# Altium footprint library WR-FPC_1.00mm.PcbLib: 105 footprints (part 4 of 7)
Each footprint in its own frame and in the unit in brackets; x right, y up, seen from the top. Pads: shape width x height; smd on the part's side, far side on the other; paste and mask are expansions set on the pad; w line width, h text height; cw(c..) or ccw(c..) is an arc to the next point about the centre after c.
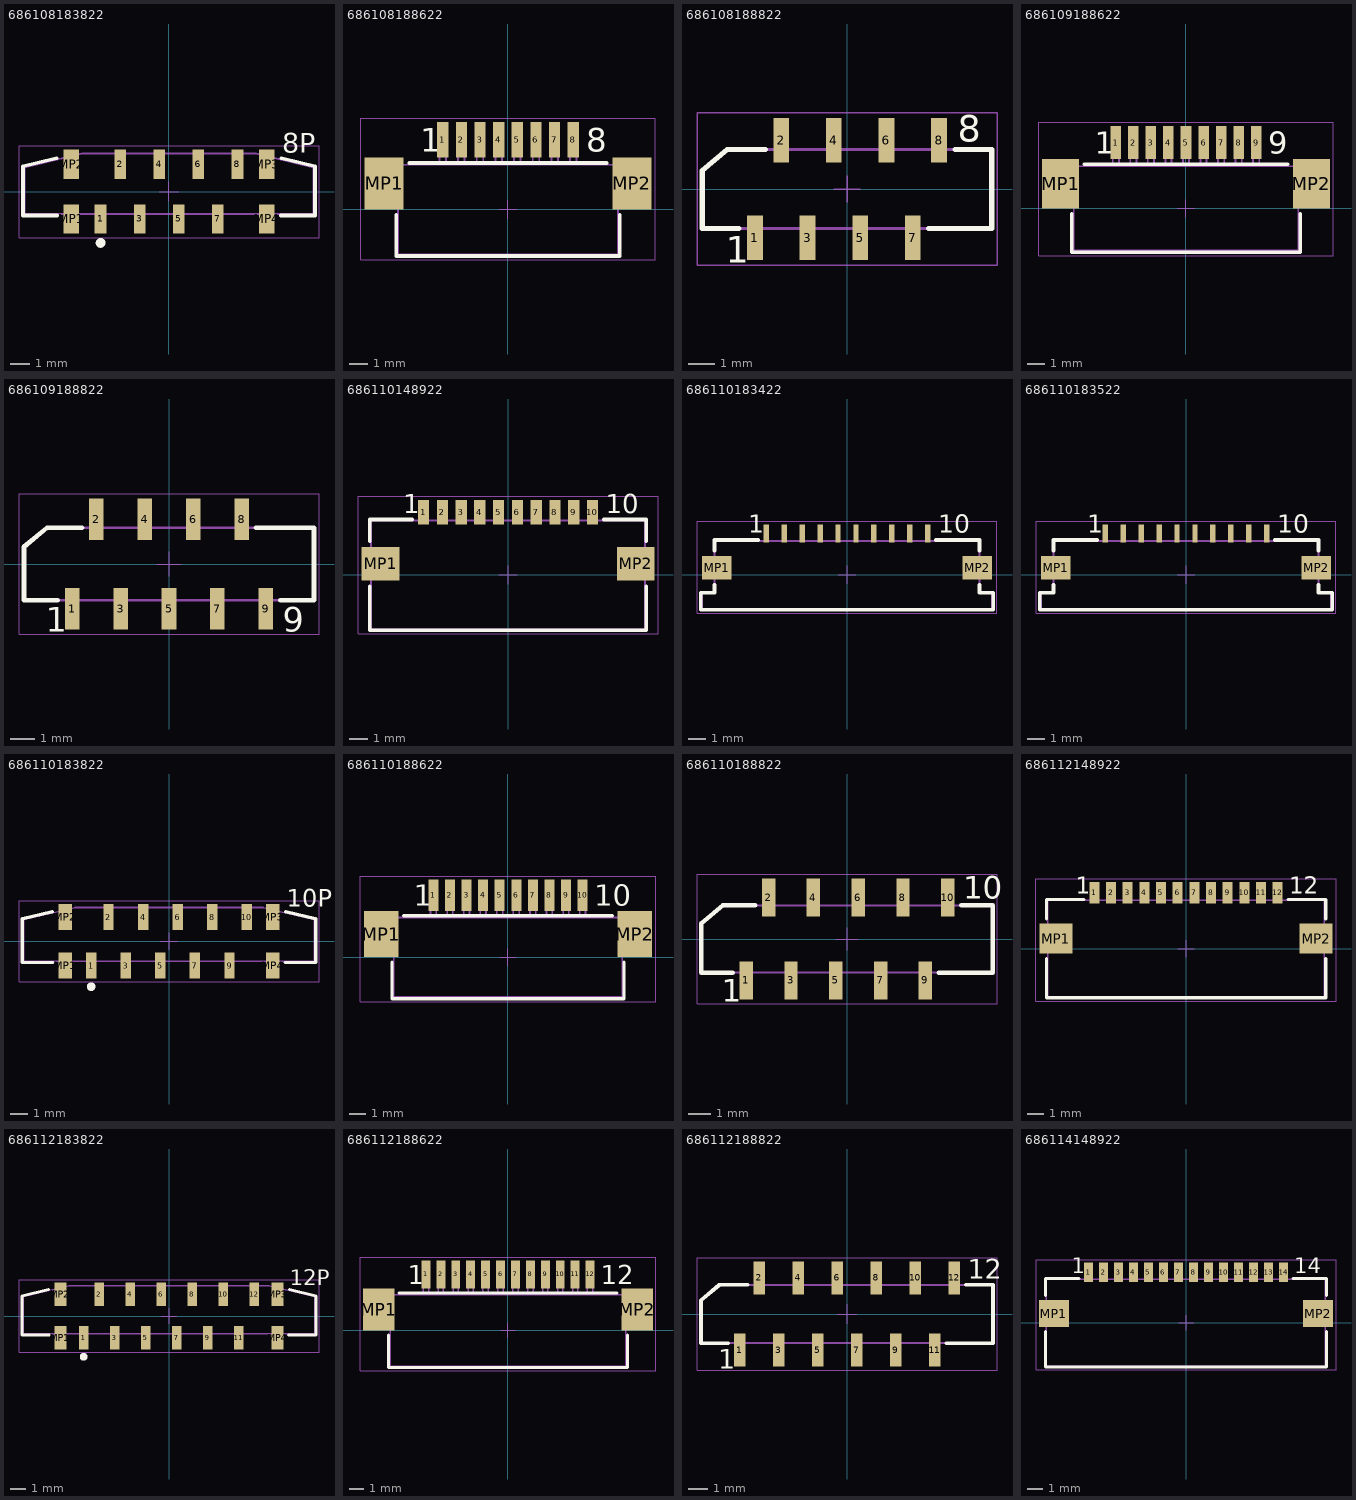
[diagram p3: the footprints below, top view; thin cyan lines are the x and y axes]

## 686108183822 [mm] "ZIF Connectors, Vertical, Type A, pitch 1mm, 8p"
height 4
pads (12):
  rect 0.6x1.5 smd: 1(-3.5,-1.4) 2(-2.5,1.4) 3(-1.5,-1.4) 4(-0.5,1.4) 5(0.5,-1.4) 6(1.5,1.4) 7(2.5,-1.4) 8(3.5,1.4)
  rect 0.8x1.5 smd: MP1(-5,-1.4) MP2(-5,1.4) MP3(5,1.4) MP4(5,-1.4)
Top Overlay:
  circle w0.25: c-3.5,-2.625 r0.125
  lines w0.2: -5.765,1.708 -7.475,1.297 -7.475,-1.225 -5.725,-1.225 ; 5.725,-1.225 7.475,-1.225 7.475,1.297 5.765,1.708
  text "8P" at 5.8,2 h1.02
Mechanical 13:
  lines w0.1: -7.4,-1.15 7.4,-1.15 7.4,1.24 4.45,1.949 -4.45,1.95 -7.4,1.24 -7.4,-1.15
Mechanical 15:
  lines w0.05: -0.5,0 0.5,0 ; 0,-0.5 0,0.5 ; -7.675,-2.35 7.675,-2.35 7.675,2.35 -7.675,2.35 -7.675,-2.35
3D body "686108183822.stp": height 4, standoff -0.02, extent -7.4,-1.65 7.4,1.95

## 686108188622 [mm] "LIF Connectors, Horizontal, Top Contact, pitch 1mm, 8p"
height 3.1
pads (10):
  rect 0.6x1.9 smd: 1(-3.5,3.75) 2(-2.5,3.75) 3(-1.5,3.75) 4(-0.5,3.75) 5(0.5,3.75) 6(1.5,3.75) 7(2.5,3.75) 8(3.5,3.75)
  rect 2.1x2.8 smd: MP1(-6.65,1.4) MP2(6.65,1.4)
Top Overlay:
  lines w0.2: -6,-0.3 -6,-2.5 6,-2.5 6,-0.3 ; -5.3,2.5 5.3,2.5
  text "8" at 4.2,3.1 h1.27
  text "1" at -4.7,3.1 h1.27
Mechanical 13:
  lines w0.1: -3.675,2.4 -3.675,4.4 -3.325,4.4 -3.325,2.4 ; -2.675,2.4 -2.675,4.4 -2.325,4.4 -2.325,2.4 ; -1.675,2.4 -1.675,4.4 -1.325,4.4 -1.325,2.4 ; -0.675,2.4 -0.675,4.4 -0.325,4.4 -0.325,2.4 ; 0.325,2.4 0.325,4.4 0.675,4.4 0.675,2.4 ; 1.325,2.4 1.325,4.4 1.675,4.4 1.675,2.4 ; 2.325,2.4 2.325,4.4 2.675,4.4 2.675,2.4 ; 3.325,2.4 3.325,4.4 3.675,4.4 3.675,2.4 ; -7.15,0.4 -5.9,0.4 -5.9,-2.4 5.9,-2.4 5.9,0.4 7.15,0.4 7.15,2.4 -7.15,2.4 -7.15,0.4
Mechanical 15:
  lines w0.05: -0.5,0 0.5,0 ; 0,-0.5 0,0.5 ; -7.9,-2.7 7.9,-2.7 7.9,4.9 -7.9,4.9 -7.9,-2.7
3D body "686108188622.stp": height 3.1, standoff -0.01, extent -7.15,-2.4 7.15,4.4

## 686108188822 [mm] "LIF Connectors, Vertical Type A,  pitch 1mm, 8p"
height 5.1
pads (8):
  rect 0.6x1.7 smd: 1(-3.5,-1.85) 2(-2.5,1.85) 3(-1.5,-1.85) 4(-0.5,1.85) 5(0.5,-1.85) 6(1.5,1.85) 7(2.5,-1.85) 8(3.5,1.85)
Top Overlay:
  lines w0.2: -4.1,-1.5 -5.5,-1.5 -5.5,0.7 -4.547,1.5 -3.1,1.5 ; 3.1,-1.5 5.5,-1.5 5.5,1.5 4.1,1.5
  text "1" at -4.6,-2.8 h1.02
  text "8" at 4.2,1.8 h1.02
Mechanical 13:
  lines w0.1: -3.675,-1.5 -3.675,-2.2 -3.325,-2.2 -3.325,-1.5 ; -2.675,1.5 -2.675,2.2 -2.325,2.2 -2.325,1.5 ; -1.675,-1.5 -1.675,-2.2 -1.325,-2.2 -1.325,-1.5 ; -0.675,1.5 -0.675,2.2 -0.325,2.2 -0.325,1.5 ; 0.325,-1.5 0.325,-2.2 0.675,-2.2 0.675,-1.5 ; 1.325,1.5 1.325,2.2 1.675,2.2 1.675,1.5 ; 2.325,-1.5 2.325,-2.2 2.675,-2.2 2.675,-1.5 ; 3.325,1.5 3.325,2.2 3.675,2.2 3.675,1.5 ; -5.5,-1.5 5.5,-1.5 5.5,1.5 -4.547,1.5 -5.5,0.7 -5.5,-1.5
Mechanical 15:
  lines w0.05: -0.5,0 0.5,0 ; 0,-0.5 0,0.5 ; -5.7,-2.9 5.7,-2.9 5.7,2.9 -5.7,2.9 -5.7,-2.9
3D body "686108188822.stp": height 5.21, standoff 0.01, extent -5.5,-2.2 5.5,2.2

## 686109188622 [mm] "LIF Connectors, Horizontal, Top Contact, pitch 1mm, 9p"
height 3.1
pads (11):
  rect 0.6x1.9 smd: 1(-4,3.75) 2(-3,3.75) 3(-2,3.75) 4(-1,3.75) 5(0,3.75) 6(1,3.75) 7(2,3.75) 8(3,3.75) 9(4,3.75)
  rect 2.1x2.8 smd: MP1(-7.15,1.4) MP2(7.15,1.4)
Top Overlay:
  lines w0.2: -6.5,-0.3 -6.5,-2.5 6.5,-2.5 6.5,-0.3 ; -5.8,2.5 5.8,2.5
  text "1" at -5.2,3.1 h1.27
  text "9" at 4.7,3.1 h1.27
Mechanical 13:
  lines w0.1: -4.175,2.4 -4.175,4.4 -3.825,4.4 -3.825,2.4 ; -3.175,2.4 -3.175,4.4 -2.825,4.4 -2.825,2.4 ; -2.175,2.4 -2.175,4.4 -1.825,4.4 -1.825,2.4 ; -1.175,2.4 -1.175,4.4 -0.825,4.4 -0.825,2.4 ; -0.175,2.4 -0.175,4.4 0.175,4.4 0.175,2.4 ; 0.825,2.4 0.825,4.4 1.175,4.4 1.175,2.4 ; 1.825,2.4 1.825,4.4 2.175,4.4 2.175,2.4 ; 2.825,2.4 2.825,4.4 3.175,4.4 3.175,2.4 ; 3.825,2.4 3.825,4.4 4.175,4.4 4.175,2.4 ; -7.65,0.4 -7.65,2.4 7.65,2.4 7.65,0.4 6.4,0.4 6.4,-2.4 -6.4,-2.4 -6.4,0.4 -7.65,0.4
Mechanical 15:
  lines w0.05: -0.5,0 0.5,0 ; 0,-0.5 0,0.5 ; -8.4,-2.7 -8.4,4.9 8.4,4.9 8.4,-2.7 -8.4,-2.7
3D body "686109188622.stp": height 3.1, standoff -0.01, extent -7.65,-2.4 7.65,4.4

## 686109188822 [mm] "LIF Connectors, Vertical Type A,  pitch 1mm, 9p"
height 5.1
pads (9):
  rect 0.6x1.7 smd: 1(-4,-1.85) 2(-3,1.85) 3(-2,-1.85) 4(-1,1.85) 5(0,-1.85) 6(1,1.85) 7(2,-1.85) 8(3,1.85) 9(4,-1.85)
Top Overlay:
  lines w0.2: -4.6,-1.5 -6,-1.5 -6,0.7 -5.047,1.5 -3.6,1.5 ; 3.6,1.5 6,1.5 6,-1.5 4.6,-1.5
  text "1" at -5.1,-2.8 h1.02
  text "9" at 4.7,-2.8 h1.02
Mechanical 13:
  lines w0.1: -4.175,-1.5 -4.175,-2.2 -3.825,-2.2 -3.825,-1.5 ; -3.175,1.5 -3.175,2.2 -2.825,2.2 -2.825,1.5 ; -2.175,-1.5 -2.175,-2.2 -1.825,-2.2 -1.825,-1.5 ; -1.175,1.5 -1.175,2.2 -0.825,2.2 -0.825,1.5 ; -0.175,-1.5 -0.175,-2.2 0.175,-2.2 0.175,-1.5 ; 0.825,1.5 0.825,2.2 1.175,2.2 1.175,1.5 ; 1.825,-1.5 1.825,-2.2 2.175,-2.2 2.175,-1.5 ; 2.825,1.5 2.825,2.2 3.175,2.2 3.175,1.5 ; 3.825,-1.5 3.825,-2.2 4.175,-2.2 4.175,-1.5 ; -6,-1.5 6,-1.5 6,1.5 -5.047,1.5 -6,0.7 -6,-1.5
Mechanical 15:
  lines w0.05: -0.5,0 0.5,0 ; 0,-0.5 0,0.5 ; -6.2,-2.9 6.2,-2.9 6.2,2.9 -6.2,2.9 -6.2,-2.9
3D body "686109188822.stp": height 5.21, standoff 0.01, extent -6,-2.2 6,2.2

## 686110148922 [mm] "ZIF Connectors, Horizontal, Bottom Contact Hinge Type, pitch 1mm, 10p"
height 2.3
pads (12):
  rect 0.6x1.3 smd: 1(-4.5,3.35) 2(-3.5,3.35) 3(-2.5,3.35) 4(-1.5,3.35) 5(-0.5,3.35) 6(0.5,3.35) 7(1.5,3.35) 8(2.5,3.35) 9(3.5,3.35) 10(4.5,3.35)
  rect 2x1.8 smd: MP1(-6.8,0.6) MP2(6.8,0.6)
Top Overlay:
  lines w0.2: -7.375,-0.6 -7.375,-2.95 7.375,-2.95 7.375,-0.6 ; -7.375,1.8 -7.375,2.95 -5.125,2.95 ; 5.125,2.95 7.375,2.95 7.375,1.8
  text "10" at 5.2,3.3 h1.02
  text "1" at -5.6,3.3 h1.02
Mechanical 13:
  lines w0.1: -7.3,-2.9 7.3,-2.9 7.3,2.9 -7.3,2.9 -7.3,-2.9
Mechanical 15:
  lines w0.05: -0.5,0 0.5,0 ; 0,-0.5 0,0.5 ; -8,-3.15 8,-3.15 8,4.2 -8,4.2 -8,-3.15
3D body "686110148922.stp": height 2.27, standoff 0.02, extent -7.3,-2.9 7.3,3.6

## 686110183422 [mm] "ZIF Connectors, Horizontal, Top Contact Low Profile, pitch 1mm, 10p"
height 1.3
pads (12):
  rect 0.3x1 smd: 1(-4.5,2.3) 2(-3.5,2.3) 3(-2.5,2.3) 4(-1.5,2.3) 5(-0.5,2.3) 6(0.5,2.3) 7(1.5,2.3) 8(2.5,2.3) 9(3.5,2.3) 10(4.5,2.3)
  rect 1.65x1.3 smd: MP1(-7.275,0.4) MP2(7.275,0.4)
Top Overlay:
  lines w0.2: -7.4,-0.55 -7.4,-1 -8.175,-1 -8.175,-1.95 8.175,-1.95 8.175,-1 7.4,-1 7.4,-0.55 ; -7.4,1.35 -7.4,1.95 -4.95,1.95 ; 4.95,1.95 7.4,1.95 7.4,1.35
  text "10" at 5.1,2.35 h1.02
  text "1" at -5.5,2.35 h1.02
Mechanical 13:
  lines w0.1: -8.1,-1 -8.1,-1.9 8.1,-1.9 8.1,-1 7.4,-1 7.4,1.9 -7.4,1.9 -7.4,-1 -8.1,-1 ; -8.1,-1 -8.1,-1
Mechanical 15:
  lines w0.05: -0.5,0 0.5,0 ; 0,-0.5 0,0.5 ; -8.375,-2.15 -8.375,3 8.375,3 8.375,-2.15 -8.375,-2.15
3D body "686110183422.stp": height 1.28, standoff -0.01, extent -8.1,-1.9 8.1,2.35

## 686110183522 [mm] "ZIF Connectors, Horizontal, Bottom Contact Low Profile, pitch 1mm, 10p"
height 1.3
pads (12):
  rect 0.3x1 smd: 1(-4.5,2.3) 2(-3.5,2.3) 3(-2.5,2.3) 4(-1.5,2.3) 5(-0.5,2.3) 6(0.5,2.3) 7(1.5,2.3) 8(2.5,2.3) 9(3.5,2.3) 10(4.5,2.3)
  rect 1.65x1.3 smd: MP1(-7.275,0.4) MP2(7.275,0.4)
Top Overlay:
  lines w0.2: -7.4,-0.55 -7.4,-1 -8.175,-1 -8.175,-1.95 8.175,-1.95 8.175,-1 7.4,-1 7.4,-0.55 ; -7.4,1.35 -7.4,1.95 -4.95,1.95 ; 4.95,1.95 7.4,1.95 7.4,1.35
  text "10" at 5.1,2.35 h1.02
  text "1" at -5.5,2.35 h1.02
Mechanical 13:
  lines w0.1: -8.1,-1 -7.4,-1 -7.4,1.9 7.4,1.9 7.4,-1 8.1,-1 8.1,-1.9 -8.1,-1.9 -8.1,-1 ; -8.1,-1 -8.1,-1
Mechanical 15:
  lines w0.05: -0.5,0 0.5,0 ; 0,-0.5 0,0.5 ; -8.375,-2.15 8.375,-2.15 8.375,3 -8.375,3 -8.375,-2.15
3D body "686110183522.stp": height 1.24, standoff -0.01, extent -8.1,-1.9 8.1,2.35

## 686110183822 [mm] "ZIF Connectors, Vertical, Type A, pitch 1mm, 10p"
height 4
pads (14):
  rect 0.6x1.5 smd: 1(-4.5,-1.4) 2(-3.5,1.4) 3(-2.5,-1.4) 4(-1.5,1.4) 5(-0.5,-1.4) 6(0.5,1.4) 7(1.5,-1.4) 8(2.5,1.4) 9(3.5,-1.4) 10(4.5,1.4)
  rect 0.8x1.5 smd: MP1(-6,-1.4) MP2(-6,1.4) MP3(6,1.4) MP4(6,-1.4)
Top Overlay:
  circle w0.25: c-4.5,-2.625 r0.125
  lines w0.2: -6.765,1.708 -8.475,1.297 -8.475,-1.225 -6.725,-1.225 ; 6.725,-1.225 8.475,-1.225 8.475,1.297 6.765,1.708
  text "10P" at 6.8,2 h1.02
Mechanical 13:
  lines w0.1: -8.4,-1.15 -8.4,1.24 -5.45,1.949 5.45,1.95 8.4,1.24 8.4,-1.15 -8.4,-1.15
Mechanical 15:
  lines w0.05: -0.5,0 0.5,0 ; 0,-0.5 0,0.5 ; -8.675,-2.35 -8.675,2.35 8.675,2.35 8.675,-2.35 -8.675,-2.35
3D body "686110183822.stp": height 4, standoff 0, extent -8.4,-1.65 8.4,1.95

## 686110188622 [mm] "LIF Connectors, Horizontal, Top Contact, pitch 1mm, 10p"
height 3.1
pads (12):
  rect 0.6x1.9 smd: 1(-4.5,3.75) 2(-3.5,3.75) 3(-2.5,3.75) 4(-1.5,3.75) 5(-0.5,3.75) 6(0.5,3.75) 7(1.5,3.75) 8(2.5,3.75) 9(3.5,3.75) 10(4.5,3.75)
  rect 2.1x2.8 smd: MP1(-7.65,1.4) MP2(7.65,1.4)
Top Overlay:
  lines w0.2: -7,-0.3 -7,-2.5 7,-2.5 7,-0.3 ; -6.3,2.5 6.3,2.5
  text "1" at -5.7,3.1 h1.27
  text "10" at 5.2,3.1 h1.27
Mechanical 13:
  lines w0.1: -4.675,2.4 -4.675,4.4 -4.325,4.4 -4.325,2.4 ; -3.675,2.4 -3.675,4.4 -3.325,4.4 -3.325,2.4 ; -2.675,2.4 -2.675,4.4 -2.325,4.4 -2.325,2.4 ; -1.675,2.4 -1.675,4.4 -1.325,4.4 -1.325,2.4 ; -0.675,2.4 -0.675,4.4 -0.325,4.4 -0.325,2.4 ; 0.325,2.4 0.325,4.4 0.675,4.4 0.675,2.4 ; 1.325,2.4 1.325,4.4 1.675,4.4 1.675,2.4 ; 2.325,2.4 2.325,4.4 2.675,4.4 2.675,2.4 ; 3.325,2.4 3.325,4.4 3.675,4.4 3.675,2.4 ; 4.325,2.4 4.325,4.4 4.675,4.4 4.675,2.4 ; -8.15,0.4 -6.9,0.4 -6.9,-2.4 6.9,-2.4 6.9,0.4 8.15,0.4 8.15,2.4 -8.15,2.4 -8.15,0.4
Mechanical 15:
  lines w0.05: -0.5,0 0.5,0 ; 0,-0.5 0,0.5 ; -8.9,-2.7 8.9,-2.7 8.9,4.9 -8.9,4.9 -8.9,-2.7
3D body "686110188622.stp": height 3.1, standoff -0.01, extent -8.15,-2.4 8.15,4.4

## 686110188822 [mm] "LIF Connectors, Vertical Type A,  pitch 1mm, 10p"
height 5.1
pads (10):
  rect 0.6x1.7 smd: 1(-4.5,-1.85) 2(-3.5,1.85) 3(-2.5,-1.85) 4(-1.5,1.85) 5(-0.5,-1.85) 6(0.5,1.85) 7(1.5,-1.85) 8(2.5,1.85) 9(3.5,-1.85) 10(4.5,1.85)
Top Overlay:
  lines w0.2: -5.1,-1.5 -6.5,-1.5 -6.5,0.7 -5.547,1.5 -4.1,1.5 ; 4.1,-1.5 6.5,-1.5 6.5,1.5 5.1,1.5
  text "1" at -5.6,-2.8 h1.02
  text "10" at 5.2,1.8 h1.02
Mechanical 13:
  lines w0.1: -4.675,-1.5 -4.675,-2.2 -4.325,-2.2 -4.325,-1.5 ; -3.675,1.5 -3.675,2.2 -3.325,2.2 -3.325,1.5 ; -2.675,-1.5 -2.675,-2.2 -2.325,-2.2 -2.325,-1.5 ; -1.675,1.5 -1.675,2.2 -1.325,2.2 -1.325,1.5 ; -0.675,-1.5 -0.675,-2.2 -0.325,-2.2 -0.325,-1.5 ; 0.325,1.5 0.325,2.2 0.675,2.2 0.675,1.5 ; 1.325,-1.5 1.325,-2.2 1.675,-2.2 1.675,-1.5 ; 2.325,1.5 2.325,2.2 2.675,2.2 2.675,1.5 ; 3.325,-1.5 3.325,-2.2 3.675,-2.2 3.675,-1.5 ; 4.325,1.5 4.325,2.2 4.675,2.2 4.675,1.5 ; -6.5,-1.5 6.5,-1.5 6.5,1.5 -5.547,1.5 -6.5,0.7 -6.5,-1.5
Mechanical 15:
  lines w0.05: -0.5,0 0.5,0 ; 0,-0.5 0,0.5 ; -6.7,-2.9 6.7,-2.9 6.7,2.9 -6.7,2.9 -6.7,-2.9
3D body "686110188822.stp": height 5.21, standoff 0.01, extent -6.5,-2.2 6.5,2.2

## 686112148922 [mm] "ZIF Connectors, Horizontal, Bottom Contact Hinge Type, pitch 1mm, 12p"
height 2.3
pads (14):
  rect 0.6x1.3 smd: 1(-5.5,3.35) 2(-4.5,3.35) 3(-3.5,3.35) 4(-2.5,3.35) 5(-1.5,3.35) 6(-0.5,3.35) 7(0.5,3.35) 8(1.5,3.35) 9(2.5,3.35) 10(3.5,3.35) 11(4.5,3.35) 12(5.5,3.35)
  rect 2x1.8 smd: MP1(-7.8,0.6) MP2(7.8,0.6)
Top Overlay:
  lines w0.2: -8.375,-0.6 -8.375,-2.95 8.375,-2.95 8.375,-0.6 ; -8.375,1.8 -8.375,2.95 -6.125,2.95 ; 6.125,2.95 8.375,2.95 8.375,1.8
  text "12" at 6.2,3.3 h1.02
  text "1" at -6.6,3.3 h1.02
Mechanical 13:
  lines w0.1: -8.3,-2.9 -8.3,2.9 8.3,2.9 8.3,-2.9 -8.3,-2.9
Mechanical 15:
  lines w0.05: -0.5,0 0.5,0 ; 0,-0.5 0,0.5 ; -9,-3.15 -9,4.2 9,4.2 9,-3.15 -9,-3.15
3D body "686112148922.stp": height 2.27, standoff 0.02, extent -8.3,-2.9 8.3,3.6

## 686112183822 [mm] "ZIF Connectors, Vertical, Type A, pitch 1mm, 12p"
height 4
pads (16):
  rect 0.6x1.5 smd: 1(-5.5,-1.4) 2(-4.5,1.4) 3(-3.5,-1.4) 4(-2.5,1.4) 5(-1.5,-1.4) 6(-0.5,1.4) 7(0.5,-1.4) 8(1.5,1.4) 9(2.5,-1.4) 10(3.5,1.4) 11(4.5,-1.4) 12(5.5,1.4)
  rect 0.8x1.5 smd: MP1(-7,-1.4) MP2(-7,1.4) MP3(7,1.4) MP4(7,-1.4)
Top Overlay:
  circle w0.25: c-5.5,-2.625 r0.125
  lines w0.2: -7.765,1.708 -9.475,1.297 -9.475,-1.225 -7.725,-1.225 ; 7.725,-1.225 9.475,-1.225 9.475,1.297 7.765,1.708
  text "12P" at 7.8,2 h1.02
Mechanical 13:
  lines w0.1: -9.4,-1.15 9.4,-1.15 9.4,1.24 6.45,1.949 -6.45,1.95 -9.4,1.24 -9.4,-1.15
Mechanical 15:
  lines w0.05: -0.5,0 0.5,0 ; 0,-0.5 0,0.5 ; -9.675,-2.35 9.675,-2.35 9.675,2.35 -9.675,2.35 -9.675,-2.35
3D body "686112183822.stp": height 4, standoff -0.02, extent -9.4,-1.65 9.4,1.95

## 686112188622 [mm] "LIF Connectors, Horizontal, Top Contact, pitch 1mm, 12p"
height 3.1
pads (14):
  rect 0.6x1.9 smd: 1(-5.5,3.75) 2(-4.5,3.75) 3(-3.5,3.75) 4(-2.5,3.75) 5(-1.5,3.75) 6(-0.5,3.75) 7(0.5,3.75) 8(1.5,3.75) 9(2.5,3.75) 10(3.5,3.75) 11(4.5,3.75) 12(5.5,3.75)
  rect 2.1x2.8 smd: MP1(-8.65,1.4) MP2(8.65,1.4)
Top Overlay:
  lines w0.2: -8,-0.3 -8,-2.5 8,-2.5 8,-0.3 ; -7.3,2.5 7.3,2.5
  text "12" at 6.2,3.1 h1.27
  text "1" at -6.7,3.1 h1.27
Mechanical 13:
  lines w0.1: -5.675,2.4 -5.675,4.4 -5.325,4.4 -5.325,2.4 ; -4.675,2.4 -4.675,4.4 -4.325,4.4 -4.325,2.4 ; -3.675,2.4 -3.675,4.4 -3.325,4.4 -3.325,2.4 ; -2.675,2.4 -2.675,4.4 -2.325,4.4 -2.325,2.4 ; -1.675,2.4 -1.675,4.4 -1.325,4.4 -1.325,2.4 ; -0.675,2.4 -0.675,4.4 -0.325,4.4 -0.325,2.4 ; 0.325,2.4 0.325,4.4 0.675,4.4 0.675,2.4 ; 1.325,2.4 1.325,4.4 1.675,4.4 1.675,2.4 ; 2.325,2.4 2.325,4.4 2.675,4.4 2.675,2.4 ; 3.325,2.4 3.325,4.4 3.675,4.4 3.675,2.4 ; 4.325,2.4 4.325,4.4 4.675,4.4 4.675,2.4 ; 5.325,2.4 5.325,4.4 5.675,4.4 5.675,2.4 ; -9.15,0.4 -9.15,2.4 9.15,2.4 9.15,0.4 7.9,0.4 7.9,-2.4 -7.9,-2.4 -7.9,0.4 -9.15,0.4
Mechanical 15:
  lines w0.05: -0.5,0 0.5,0 ; 0,-0.5 0,0.5 ; -9.9,-2.7 -9.9,4.9 9.9,4.9 9.9,-2.7 -9.9,-2.7
3D body "686112188622.stp": height 3.1, standoff -0.01, extent -9.15,-2.4 9.15,4.4

## 686112188822 [mm] "LIF Connectors, Vertical Type A,  pitch 1mm, 12p"
height 5.1
pads (12):
  rect 0.6x1.7 smd: 1(-5.5,-1.85) 2(-4.5,1.85) 3(-3.5,-1.85) 4(-2.5,1.85) 5(-1.5,-1.85) 6(-0.5,1.85) 7(0.5,-1.85) 8(1.5,1.85) 9(2.5,-1.85) 10(3.5,1.85) 11(4.5,-1.85) 12(5.5,1.85)
Top Overlay:
  lines w0.2: -6.1,-1.5 -7.5,-1.5 -7.5,0.7 -6.547,1.5 -5.1,1.5 ; 5.1,-1.5 7.5,-1.5 7.5,1.5 6.1,1.5
  text "1" at -6.6,-2.8 h1.02
  text "12" at 6.2,1.8 h1.02
Mechanical 13:
  lines w0.1: -5.675,-1.5 -5.675,-2.2 -5.325,-2.2 -5.325,-1.5 ; -4.675,1.5 -4.675,2.2 -4.325,2.2 -4.325,1.5 ; -3.675,-1.5 -3.675,-2.2 -3.325,-2.2 -3.325,-1.5 ; -2.675,1.5 -2.675,2.2 -2.325,2.2 -2.325,1.5 ; -1.675,-1.5 -1.675,-2.2 -1.325,-2.2 -1.325,-1.5 ; -0.675,1.5 -0.675,2.2 -0.325,2.2 -0.325,1.5 ; 0.325,-1.5 0.325,-2.2 0.675,-2.2 0.675,-1.5 ; 1.325,1.5 1.325,2.2 1.675,2.2 1.675,1.5 ; 2.325,-1.5 2.325,-2.2 2.675,-2.2 2.675,-1.5 ; 3.325,1.5 3.325,2.2 3.675,2.2 3.675,1.5 ; 4.325,-1.5 4.325,-2.2 4.675,-2.2 4.675,-1.5 ; 5.325,1.5 5.325,2.2 5.675,2.2 5.675,1.5 ; -7.5,-1.5 -7.5,0.7 -6.547,1.5 7.5,1.5 7.5,-1.5 -7.5,-1.5
Mechanical 15:
  lines w0.05: -0.5,0 0.5,0 ; 0,-0.5 0,0.5 ; -7.7,-2.9 -7.7,2.9 7.7,2.9 7.7,-2.9 -7.7,-2.9
3D body "686112188822.stp": height 5.21, standoff 0.01, extent -7.5,-2.2 7.5,2.2

## 686114148922 [mm] "ZIF Connectors, Horizontal, Bottom Contact Hinge Type, pitch 1mm, 14p"
height 2.3
pads (16):
  rect 0.6x1.3 smd: 1(-6.5,3.35) 2(-5.5,3.35) 3(-4.5,3.35) 4(-3.5,3.35) 5(-2.5,3.35) 6(-1.5,3.35) 7(-0.5,3.35) 8(0.5,3.35) 9(1.5,3.35) 10(2.5,3.35) 11(3.5,3.35) 12(4.5,3.35) 13(5.5,3.35) 14(6.5,3.35)
  rect 2x1.8 smd: MP1(-8.8,0.6) MP2(8.8,0.6)
Top Overlay:
  lines w0.2: -9.375,-0.6 -9.375,-2.95 9.375,-2.95 9.375,-0.6 ; -9.375,1.8 -9.375,2.95 -7.125,2.95 ; 7.125,2.95 9.375,2.95 9.375,1.8
  text "14" at 7.2,3.3 h1.02
  text "1" at -7.6,3.3 h1.02
Mechanical 13:
  lines w0.1: -9.3,-2.9 9.3,-2.9 9.3,2.9 -9.3,2.9 -9.3,-2.9
Mechanical 15:
  lines w0.05: -0.5,0 0.5,0 ; 0,-0.5 0,0.5 ; -10,-3.15 10,-3.15 10,4.2 -10,4.2 -10,-3.15
3D body "686114148922.stp": height 2.27, standoff 0.02, extent -9.3,-2.9 9.3,3.6